# Altium footprint library ParsaLibrary.PcbLib: 526 footprints (part 9 of 33)
Each footprint in its own frame and in the unit in brackets; x right, y up, seen from the top. Pads: shape width x height; smd on the part's side, far side on the other; paste and mask are expansions set on the pad; w line width, h text height; cw(c..) or ccw(c..) is an arc to the next point about the centre after c.
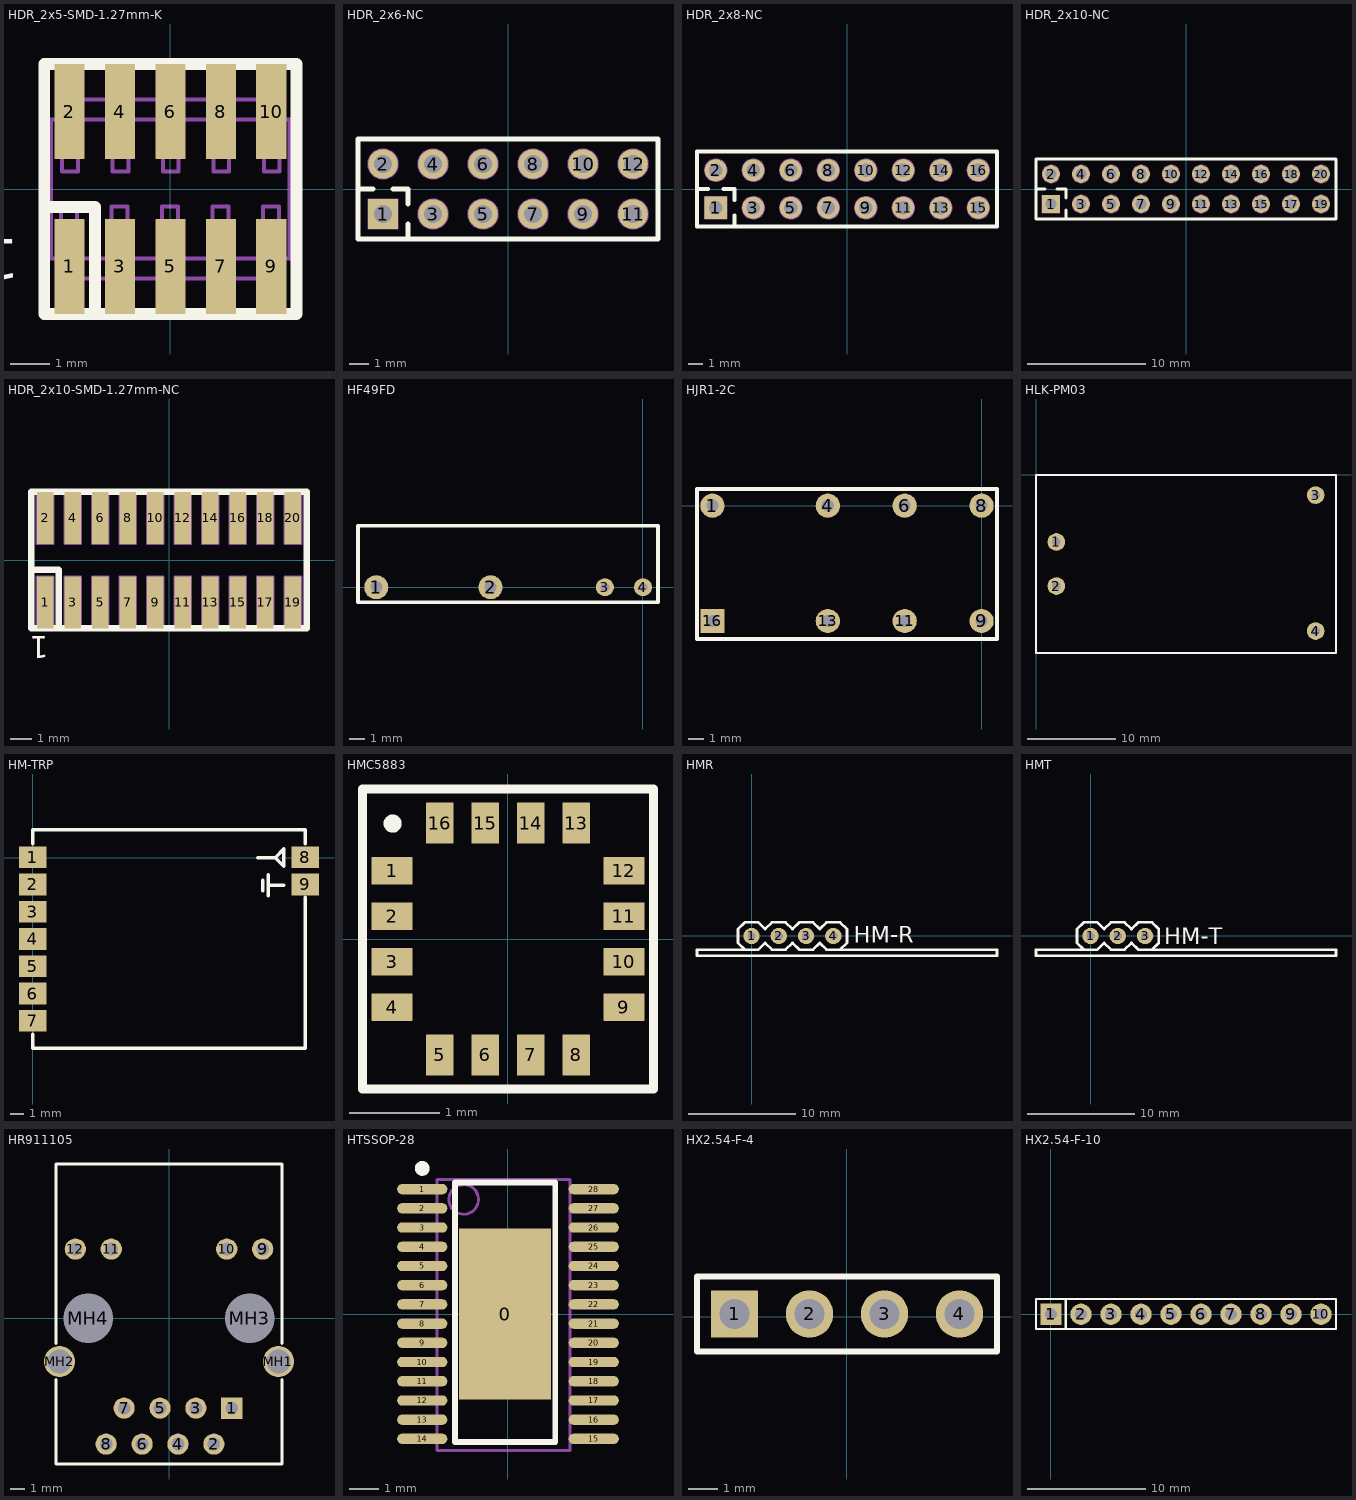
[diagram p8: the footprints below, top view; thin cyan lines are the x and y axes]

## HDR_2x5-SMD-1.27mm-K [mm]
pads (10):
  rect 0.76x2.4 smd: 1(-2.54,-1.95) 2(-2.54,1.95) 3(-1.27,-1.95) 4(-1.27,1.95) 5(0,-1.95) 6(0,1.95) 7(1.27,-1.95) 8(1.27,1.95) 9(2.54,-1.95) 10(2.54,1.95)
Top Overlay:
  lines w0.3: -3.175,-0.45 -1.9,-0.45 -1.9,-3.15 ; -3.175,-3.15 -3.175,3.15 3.175,3.15 3.175,-3.15 -3.175,-3.15
  text "1" at -3.81,-1.27 h1.02
Mechanical 7:
  lines w0.1: -2.74,-1.75 -2.74,-2.459 ccw(c-2.54,-2.459) -2.34,-2.459 -2.34,-2.25 ; -2.74,1.75 -2.74,2.459 cw(c-2.54,2.459) -2.34,2.459 -2.34,2.25 ; -2.5,-1.75 -2.5,-2.25 -1.25,-2.25 ; -2.5,1.75 -2.5,2.25 2.5,2.25 2.5,1.75 ; -1.47,-2.25 -1.47,-2.459 ccw(c-1.27,-2.459) -1.07,-2.459 -1.07,-2.25 ; -1.47,2.25 -1.47,2.459 cw(c-1.27,2.459) -1.07,2.459 -1.07,2.25 ; -1.25,-1.75 -1.25,-2.25 ; -0.2,-2.25 -0.2,-2.459 ccw(c0,-2.459) 0.2,-2.459 0.2,-2.25 ; -0.2,2.25 -0.2,2.459 cw(c0,2.459) 0.2,2.459 0.2,2.25 ; 1.07,-2.25 1.07,-2.459 ccw(c1.27,-2.459) 1.47,-2.459 1.47,-2.25 ; 1.07,2.25 1.07,2.459 cw(c1.27,2.459) 1.47,2.459 1.47,2.25 ; 1.25,-1.75 1.25,-2.25 ; 2.34,-2.25 2.34,-2.459 ccw(c2.54,-2.459) 2.74,-2.459 2.74,-1.75 ; 2.34,2.25 2.34,2.459 cw(c2.54,2.459) 2.74,2.459 2.74,1.75 ; 2.5,-1.75 2.5,-2.25 1.25,-2.25 ; -1.25,-2.25 1.25,-2.25 ; -3,-1.75 3,-1.75 3,1.75 -3,1.75 -3,-1.75 ; -2.75,-0.835 -2.35,-0.835 -2.35,-0.435 -2.75,-0.435 -2.75,-0.835 ; -2.73,0.435 -2.33,0.435 -2.33,0.835 -2.73,0.835 -2.73,0.435 ; -1.48,-0.835 -1.08,-0.835 -1.08,-0.435 -1.48,-0.435 -1.48,-0.835 ; -1.46,0.435 -1.06,0.435 -1.06,0.835 -1.46,0.835 -1.46,0.435 ; -0.21,-0.835 0.19,-0.835 0.19,-0.435 -0.21,-0.435 -0.21,-0.835 ; -0.19,0.435 0.21,0.435 0.21,0.835 -0.19,0.835 -0.19,0.435 ; 1.06,-0.835 1.46,-0.835 1.46,-0.435 1.06,-0.435 1.06,-0.835 ; 1.08,0.435 1.48,0.435 1.48,0.835 1.08,0.835 1.08,0.435 ; 2.33,-0.835 2.73,-0.835 2.73,-0.435 2.33,-0.435 2.33,-0.835 ; 2.35,0.435 2.75,0.435 2.75,0.835 2.35,0.835 2.35,0.435
  text ".Designator" at 0.356,0.152 h0.3
3D body "Samtec-FTSH-105-01-F-DV-K.step": height 6.11, standoff -0.01, extent -3.137,-2.921 3.137,2.921

## HDR_2x6-NC [mm]
pads (12):
  rect 1.5x1.5 hole 0.9: 1(-6.35,-1.27)
  round 1.5 hole 0.9: 2(-6.35,1.27) 3(-3.81,-1.27) 4(-3.81,1.27) 5(-1.27,-1.27) 6(-1.27,1.27) 7(1.27,-1.27) 8(1.27,1.27) 9(3.81,-1.27) 10(3.81,1.27) 11(6.35,-1.27) 12(6.35,1.27)
Top Overlay:
  lines w0.254: -7.62,0 -6.858,0 ; -5.842,0 -5.08,0 -5.08,-0.762 ; -5.08,-2.54 -5.08,-1.778 ; -7.62,-2.54 7.62,-2.54 7.62,2.54 -7.62,2.54 -7.62,-2.54
Mechanical 7:
  circle w0.1: c6.35,-1.27 r0.45
  circle w0.1: c6.35,-1.27 r0.75
  circle w0.1: c6.35,1.27 r0.75
  circle w0.1: c6.35,1.27 r0.45
  circle w0.1: c3.81,-1.27 r0.45
  circle w0.1: c3.81,-1.27 r0.75
  circle w0.1: c3.81,1.27 r0.75
  circle w0.1: c3.81,1.27 r0.45
  circle w0.1: c1.27,-1.27 r0.45
  circle w0.1: c1.27,-1.27 r0.75
  circle w0.1: c1.27,1.27 r0.75
  circle w0.1: c1.27,1.27 r0.45
  circle w0.1: c-1.27,-1.27 r0.45
  circle w0.1: c-1.27,-1.27 r0.75
  circle w0.1: c-1.27,1.27 r0.75
  circle w0.1: c-1.27,1.27 r0.45
  circle w0.1: c-3.81,1.27 r0.45
  circle w0.1: c-3.81,1.27 r0.75
  circle w0.1: c-6.35,1.27 r0.45
  circle w0.1: c-6.35,1.27 r0.75
  circle w0.1: c-3.81,-1.27 r0.75
  circle w0.1: c-3.81,-1.27 r0.45
  circle w0.1: c-6.35,-1.27 r0.45
  lines w0.1: -7.62,0 -6.858,0 ; -5.842,0 -5.08,0 -5.08,-0.762 ; -5.08,-2.54 -5.08,-1.778 ; -7.62,-2.54 -7.62,2.54 7.62,2.54 7.62,-2.54 -7.62,-2.54 ; -7.1,-2.02 -5.6,-2.02 -5.6,-0.52 -7.1,-0.52 -7.1,-2.02
  text ".Designator" at -0.525,-0.1 h0.31
Mechanical 8:
  circle w0.1: c-6.35,-1.27 r0.45
  circle w0.1: c-3.81,-1.27 r0.45
  circle w0.1: c-3.81,-1.27 r0.75
  circle w0.1: c-6.35,1.27 r0.75
  circle w0.1: c-6.35,1.27 r0.45
  circle w0.1: c-3.81,1.27 r0.75
  circle w0.1: c-3.81,1.27 r0.45
  circle w0.1: c-1.27,1.27 r0.45
  circle w0.1: c-1.27,1.27 r0.75
  circle w0.1: c-1.27,-1.27 r0.75
  circle w0.1: c-1.27,-1.27 r0.45
  circle w0.1: c1.27,1.27 r0.45
  circle w0.1: c1.27,1.27 r0.75
  circle w0.1: c1.27,-1.27 r0.75
  circle w0.1: c1.27,-1.27 r0.45
  circle w0.1: c3.81,1.27 r0.45
  circle w0.1: c3.81,1.27 r0.75
  circle w0.1: c3.81,-1.27 r0.75
  circle w0.1: c3.81,-1.27 r0.45
  circle w0.1: c6.35,1.27 r0.45
  circle w0.1: c6.35,1.27 r0.75
  circle w0.1: c6.35,-1.27 r0.75
  circle w0.1: c6.35,-1.27 r0.45
  lines w0.1: -7.1,-2.02 -7.1,-0.52 -5.6,-0.52 -5.6,-2.02 -7.1,-2.02

## HDR_2x8-NC [mm]
pads (16):
  rect 1.5x1.5 hole 0.9: 1(-8.89,-1.27)
  round 1.5 hole 0.9: 2(-8.89,1.27) 3(-6.35,-1.27) 4(-6.35,1.27) 5(-3.81,-1.27) 6(-3.81,1.27) 7(-1.27,-1.27) 8(-1.27,1.27) 9(1.27,-1.27) 10(1.27,1.27) 11(3.81,-1.27) 12(3.81,1.27) 13(6.35,-1.27) 14(6.35,1.27) 15(8.89,-1.27) 16(8.89,1.27)
Top Overlay:
  lines w0.254: -10.16,0 -9.398,0 ; -8.382,0 -7.62,0 -7.62,-0.762 ; -7.62,-2.54 -7.62,-1.778 ; -10.16,-2.54 -10.16,2.54 10.16,2.54 10.16,-2.54 -10.16,-2.54
Mechanical 7:
  circle w0.1: c-8.89,-1.27 r0.45
  circle w0.1: c-6.35,-1.27 r0.45
  circle w0.1: c-6.35,-1.27 r0.75
  circle w0.1: c-8.89,1.27 r0.75
  circle w0.1: c-8.89,1.27 r0.45
  circle w0.1: c-6.35,1.27 r0.75
  circle w0.1: c-6.35,1.27 r0.45
  circle w0.1: c-3.81,1.27 r0.45
  circle w0.1: c-3.81,1.27 r0.75
  circle w0.1: c-3.81,-1.27 r0.75
  circle w0.1: c-3.81,-1.27 r0.45
  circle w0.1: c-1.27,1.27 r0.45
  circle w0.1: c-1.27,1.27 r0.75
  circle w0.1: c-1.27,-1.27 r0.75
  circle w0.1: c-1.27,-1.27 r0.45
  circle w0.1: c1.27,1.27 r0.45
  circle w0.1: c1.27,1.27 r0.75
  circle w0.1: c1.27,-1.27 r0.75
  circle w0.1: c1.27,-1.27 r0.45
  circle w0.1: c3.81,1.27 r0.45
  circle w0.1: c3.81,1.27 r0.75
  circle w0.1: c3.81,-1.27 r0.75
  circle w0.1: c3.81,-1.27 r0.45
  circle w0.1: c6.35,1.27 r0.45
  circle w0.1: c6.35,1.27 r0.75
  circle w0.1: c6.35,-1.27 r0.75
  circle w0.1: c6.35,-1.27 r0.45
  circle w0.1: c8.89,1.27 r0.45
  circle w0.1: c8.89,1.27 r0.75
  circle w0.1: c8.89,-1.27 r0.75
  circle w0.1: c8.89,-1.27 r0.45
  lines w0.1: -10.16,0 -9.398,0 ; -8.382,0 -7.62,0 -7.62,-0.762 ; -7.62,-2.54 -7.62,-1.778 ; -10.16,-2.54 10.16,-2.54 10.16,2.54 -10.16,2.54 -10.16,-2.54 ; -9.64,-2.02 -9.64,-0.52 -8.14,-0.52 -8.14,-2.02 -9.64,-2.02
  text ".Designator" at -0.525,-0.1 h0.31
Mechanical 8:
  circle w0.1: c8.89,-1.27 r0.45
  circle w0.1: c8.89,-1.27 r0.75
  circle w0.1: c8.89,1.27 r0.75
  circle w0.1: c8.89,1.27 r0.45
  circle w0.1: c6.35,-1.27 r0.45
  circle w0.1: c6.35,-1.27 r0.75
  circle w0.1: c6.35,1.27 r0.75
  circle w0.1: c6.35,1.27 r0.45
  circle w0.1: c3.81,-1.27 r0.45
  circle w0.1: c3.81,-1.27 r0.75
  circle w0.1: c3.81,1.27 r0.75
  circle w0.1: c3.81,1.27 r0.45
  circle w0.1: c1.27,-1.27 r0.45
  circle w0.1: c1.27,-1.27 r0.75
  circle w0.1: c1.27,1.27 r0.75
  circle w0.1: c1.27,1.27 r0.45
  circle w0.1: c-1.27,-1.27 r0.45
  circle w0.1: c-1.27,-1.27 r0.75
  circle w0.1: c-1.27,1.27 r0.75
  circle w0.1: c-1.27,1.27 r0.45
  circle w0.1: c-3.81,-1.27 r0.45
  circle w0.1: c-3.81,-1.27 r0.75
  circle w0.1: c-3.81,1.27 r0.75
  circle w0.1: c-3.81,1.27 r0.45
  circle w0.1: c-6.35,1.27 r0.45
  circle w0.1: c-6.35,1.27 r0.75
  circle w0.1: c-8.89,1.27 r0.45
  circle w0.1: c-8.89,1.27 r0.75
  circle w0.1: c-6.35,-1.27 r0.75
  circle w0.1: c-6.35,-1.27 r0.45
  circle w0.1: c-8.89,-1.27 r0.45
  lines w0.1: -9.64,-2.02 -8.14,-2.02 -8.14,-0.52 -9.64,-0.52 -9.64,-2.02

## HDR_2x10-NC [mm]
pads (20):
  rect 1.5x1.5 hole 0.9: 1(-11.43,-1.27)
  round 1.5 hole 0.9: 2(-11.43,1.27) 3(-8.89,-1.27) 4(-8.89,1.27) 5(-6.35,-1.27) 6(-6.35,1.27) 7(-3.81,-1.27) 8(-3.81,1.27) 9(-1.27,-1.27) 10(-1.27,1.27) 11(1.27,-1.27) 12(1.27,1.27) 13(3.81,-1.27) 14(3.81,1.27) 15(6.35,-1.27) 16(6.35,1.27) 17(8.89,-1.27) 18(8.89,1.27) 19(11.43,-1.27) 20(11.43,1.27)
Top Overlay:
  lines w0.254: -12.7,0 -11.938,0 ; -10.922,0 -10.16,0 -10.16,-0.762 ; -10.16,-2.54 -10.16,-1.778 ; -12.7,-2.54 -12.7,2.54 12.7,2.54 12.7,-2.54 -12.7,-2.54
Mechanical 7:
  circle w0.1: c-11.43,-1.27 r0.45
  circle w0.1: c-8.89,-1.27 r0.45
  circle w0.1: c-8.89,-1.27 r0.75
  circle w0.1: c-11.43,1.27 r0.75
  circle w0.1: c-11.43,1.27 r0.45
  circle w0.1: c-8.89,1.27 r0.75
  circle w0.1: c-8.89,1.27 r0.45
  circle w0.1: c-6.35,1.27 r0.45
  circle w0.1: c-6.35,1.27 r0.75
  circle w0.1: c-6.35,-1.27 r0.75
  circle w0.1: c-6.35,-1.27 r0.45
  circle w0.1: c-3.81,1.27 r0.45
  circle w0.1: c-3.81,1.27 r0.75
  circle w0.1: c-3.81,-1.27 r0.75
  circle w0.1: c-3.81,-1.27 r0.45
  circle w0.1: c-1.27,1.27 r0.45
  circle w0.1: c-1.27,1.27 r0.75
  circle w0.1: c-1.27,-1.27 r0.75
  circle w0.1: c-1.27,-1.27 r0.45
  circle w0.1: c1.27,1.27 r0.45
  circle w0.1: c1.27,1.27 r0.75
  circle w0.1: c1.27,-1.27 r0.75
  circle w0.1: c1.27,-1.27 r0.45
  circle w0.1: c3.81,1.27 r0.45
  circle w0.1: c3.81,1.27 r0.75
  circle w0.1: c3.81,-1.27 r0.75
  circle w0.1: c3.81,-1.27 r0.45
  circle w0.1: c6.35,1.27 r0.45
  circle w0.1: c6.35,1.27 r0.75
  circle w0.1: c6.35,-1.27 r0.75
  circle w0.1: c6.35,-1.27 r0.45
  circle w0.1: c8.89,1.27 r0.45
  circle w0.1: c8.89,1.27 r0.75
  circle w0.1: c8.89,-1.27 r0.75
  circle w0.1: c8.89,-1.27 r0.45
  circle w0.1: c11.43,1.27 r0.45
  circle w0.1: c11.43,1.27 r0.75
  circle w0.1: c11.43,-1.27 r0.75
  circle w0.1: c11.43,-1.27 r0.45
  lines w0.1: -12.7,0 -11.938,0 ; -10.922,0 -10.16,0 -10.16,-0.762 ; -10.16,-2.54 -10.16,-1.778 ; -12.7,-2.54 12.7,-2.54 12.7,2.54 -12.7,2.54 -12.7,-2.54 ; -12.18,-2.02 -12.18,-0.52 -10.68,-0.52 -10.68,-2.02 -12.18,-2.02
  text ".Designator" at -0.525,-0.1 h0.31
Mechanical 8:
  circle w0.1: c11.43,-1.27 r0.45
  circle w0.1: c11.43,-1.27 r0.75
  circle w0.1: c11.43,1.27 r0.75
  circle w0.1: c11.43,1.27 r0.45
  circle w0.1: c8.89,-1.27 r0.45
  circle w0.1: c8.89,-1.27 r0.75
  circle w0.1: c8.89,1.27 r0.75
  circle w0.1: c8.89,1.27 r0.45
  circle w0.1: c6.35,-1.27 r0.45
  circle w0.1: c6.35,-1.27 r0.75
  circle w0.1: c6.35,1.27 r0.75
  circle w0.1: c6.35,1.27 r0.45
  circle w0.1: c3.81,-1.27 r0.45
  circle w0.1: c3.81,-1.27 r0.75
  circle w0.1: c3.81,1.27 r0.75
  circle w0.1: c3.81,1.27 r0.45
  circle w0.1: c1.27,-1.27 r0.45
  circle w0.1: c1.27,-1.27 r0.75
  circle w0.1: c1.27,1.27 r0.75
  circle w0.1: c1.27,1.27 r0.45
  circle w0.1: c-1.27,-1.27 r0.45
  circle w0.1: c-1.27,-1.27 r0.75
  circle w0.1: c-1.27,1.27 r0.75
  circle w0.1: c-1.27,1.27 r0.45
  circle w0.1: c-3.81,-1.27 r0.45
  circle w0.1: c-3.81,-1.27 r0.75
  circle w0.1: c-3.81,1.27 r0.75
  circle w0.1: c-3.81,1.27 r0.45
  circle w0.1: c-6.35,-1.27 r0.45
  circle w0.1: c-6.35,-1.27 r0.75
  circle w0.1: c-6.35,1.27 r0.75
  circle w0.1: c-6.35,1.27 r0.45
  circle w0.1: c-8.89,1.27 r0.45
  circle w0.1: c-8.89,1.27 r0.75
  circle w0.1: c-11.43,1.27 r0.45
  circle w0.1: c-11.43,1.27 r0.75
  circle w0.1: c-8.89,-1.27 r0.75
  circle w0.1: c-8.89,-1.27 r0.45
  circle w0.1: c-11.43,-1.27 r0.45
  lines w0.1: -12.18,-2.02 -10.68,-2.02 -10.68,-0.52 -12.18,-0.52 -12.18,-2.02

## HDR_2x10-SMD-1.27mm-NC [mm]
pads (20):
  rect 0.76x2.4 smd paste-5: 1(-5.715,-1.95) 2(-5.715,1.95) 3(-4.445,-1.95) 4(-4.445,1.95) 5(-3.175,-1.95) 6(-3.175,1.95) 7(-1.905,-1.95) 8(-1.905,1.95) 9(-0.635,-1.95) 10(-0.635,1.95) 11(0.635,-1.95) 12(0.635,1.95) 13(1.905,-1.95) 14(1.905,1.95) 15(3.175,-1.95) 16(3.175,1.95) 17(4.445,-1.95) 18(4.445,1.95) 19(5.715,-1.95) 20(5.715,1.95)
Top Overlay:
  lines w0.3: -6.35,-0.45 -5.075,-0.45 -5.075,-3.15 ; -6.35,-3.15 -6.35,3.15 6.35,3.15 6.35,-3.15 -6.35,-3.15
  text "1" at -5.537,-3.505 h1.02
Mechanical 7:
  lines w0.1: -6.35,-3.15 6.35,-3.15 6.35,3.15 -6.35,3.15 -6.35,-3.15 ; -6.095,-3.15 -5.335,-3.15 -5.335,-0.75 -6.095,-0.75 -6.095,-3.15 ; -6.095,0.75 -5.335,0.75 -5.335,3.15 -6.095,3.15 -6.095,0.75 ; -4.825,-3.15 -4.065,-3.15 -4.065,-0.75 -4.825,-0.75 -4.825,-3.15 ; -4.825,0.75 -4.065,0.75 -4.065,3.15 -4.825,3.15 -4.825,0.75 ; -3.555,-3.15 -2.795,-3.15 -2.795,-0.75 -3.555,-0.75 -3.555,-3.15 ; -3.555,0.75 -3.555,3.15 -2.795,3.15 -2.795,0.75 -3.555,0.75 ; -2.285,-3.15 -1.525,-3.15 -1.525,-0.75 -2.285,-0.75 -2.285,-3.15 ; -2.285,0.75 -1.525,0.75 -1.525,3.15 -2.285,3.15 -2.285,0.75 ; -1.015,-3.15 -0.255,-3.15 -0.255,-0.75 -1.015,-0.75 -1.015,-3.15 ; -1.015,0.75 -0.255,0.75 -0.255,3.15 -1.015,3.15 -1.015,0.75 ; 0.255,-3.15 1.015,-3.15 1.015,-0.75 0.255,-0.75 0.255,-3.15 ; 0.255,0.75 1.015,0.75 1.015,3.15 0.255,3.15 0.255,0.75 ; 1.525,-3.15 2.285,-3.15 2.285,-0.75 1.525,-0.75 1.525,-3.15 ; 1.525,0.75 2.285,0.75 2.285,3.15 1.525,3.15 1.525,0.75 ; 2.795,-3.15 3.555,-3.15 3.555,-0.75 2.795,-0.75 2.795,-3.15 ; 2.795,0.75 3.555,0.75 3.555,3.15 2.795,3.15 2.795,0.75 ; 4.065,-3.15 4.825,-3.15 4.825,-0.75 4.065,-0.75 4.065,-3.15 ; 4.065,0.75 4.825,0.75 4.825,3.15 4.065,3.15 4.065,0.75 ; 5.335,-3.15 6.095,-3.15 6.095,-0.75 5.335,-0.75 5.335,-3.15 ; 5.335,0.75 6.095,0.75 6.095,3.15 5.335,3.15 5.335,0.75
  text ".Designator" at -0.8,-0.2 h0.38

## HF49FD [mm]
pads (4):
  round 1.6 hole 0.8: 1(-17.78,0) 2(-10.16,0)
  round 1.2 hole 0.6: 3(-2.54,0) 4(0,0)
Top Overlay:
  lines w0.254: -19,-1 -19,4.1 1,4.1 1,-1 -19,-1
3D body "User Library-HF49FD-1H12.step": height 12.5, standoff -3.2, extent -19,-0.95 1,4.1

## HJR1-2C [mm]
pads (8):
  round 1.6 hole 0.8: 1(-17.78,0) 4(-10.16,0) 6(-5.08,0) 8(0,0) 9(0,-7.62) 11(-5.08,-7.62) 13(-10.16,-7.62)
  rect 1.6x1.6 hole 0.8: 16(-17.78,-7.62)
Top Overlay:
  lines w0.254: 1,-8.8 -18.8,-8.8 -18.8,1.09 1,1.09 ; 1.02,-8.8 1.02,1.09
3D body: height -1, standoff -3, extent -5.33,-7.87 -4.83,-7.37
3D body: height -1, standoff -3, extent -10.41,-7.87 -9.91,-7.37
3D body: height -1, standoff -3, extent -18.03,-7.87 -17.53,-7.37
3D body: height -1, standoff -3, extent -10.39,-0.21 -9.89,0.29
3D body: height -1, standoff -3, extent -5.31,-0.21 -4.81,0.29
3D body: height -1, standoff -3, extent -18.03,-0.25 -17.53,0.25
3D body: height 6.9, standoff 0, extent -18.8,-8.8 1,1.11
3D body: height -1, standoff -3, extent -0.25,-7.87 0.25,-7.37
3D body: height -1, standoff -3, extent -0.23,-0.25 0.27,0.25

## HLK-PM03 [mm]
height 15
pads (4):
  round 2 hole 1: 1(2.3,-7.6) 2(2.3,-12.6) 3(31.7,-2.3) 4(31.7,-17.7)
Top Overlay:
  lines w0.254: 0,-20.2 34,-20.2 34,0 0,0 0,-20.2
3D body "User Library-HLK-PM01.step": height 15.1, standoff -5, extent 0,-20.2 34,0

## HM-TRP [mm]
pads (9):
  rect 2x1.6 smd: 1(0,0.032) 2(0,-1.968) 3(0,-3.968) 4(0,-5.968) 5(0,-7.968) 6(0,-9.968) 7(0,-11.968) 8(20,0.032) 9(20,-1.968)
Top Overlay:
  lines w0.254: 0,-12.954 0,-13.968 20,-13.968 20,-2.921 ; 0,1.016 0,2.032 20,2.032 20,1.016 ; 16.51,0 17.78,0 ; 16.891,-2.413 16.891,-1.651 ; 17.272,-2.794 17.272,-1.27 ; 17.272,-2.032 18.415,-2.032 ; 17.78,0 18.415,0.635 18.415,-0.635 ; 17.78,0 18.415,-0.635 ; 17.78,0 18.415,-0.635
3D body "User Library-HM-TRP-868S.step": height 2, standoff -0.01, extent 0.033,-13.969 20.033,2.031

## HMC5883 [mm]
pads (16):
  rect 0.45x0.3 smd mask+0.01: 1(-1.275,0.75) 2(-1.275,0.25) 3(-1.275,-0.25) 4(-1.275,-0.75) 9(1.275,-0.75) 10(1.275,-0.25) 11(1.275,0.25) 12(1.275,0.75)
  rect 0.3x0.45 smd mask+0.01: 5(-0.75,-1.275) 6(-0.25,-1.275) 7(0.25,-1.275) 8(0.75,-1.275) 13(0.75,1.275) 14(0.25,1.275) 15(-0.25,1.275) 16(-0.75,1.275)
Top Overlay:
  circle w0.1: c-1.27,1.27 r0.05
  lines w0.1: -1.6,-1.651 -1.6,1.651 1.6,1.651 1.6,-1.651 -1.6,-1.651
3D body: height 0.8, standoff 0, extent -1.549,-1.6 1.549,1.6

## HMR [mil]
height 551.18
pads (4):
  round 60 hole 30: 1(0,0) 2(100,0) 3(200,0) 4(300,0)
Top Overlay:
  lines w10: -25,-50 25,-50 50,-25 75,-50 125,-50 150,-25 175,-50 225,-50 250,-25 275,-50 325,-50 ; -25,-50 -200,-50 -200,-72.17 900,-72.17 900,-50 325,-50 ; -25,-50 -50,-25 -50,25 -25,50 25,50 50,25 75,50 125,50 150,25 175,50 225,50 250,25 275,50 325,50 350,25 350,-25 325,-50
  text "HM-R" at 375,-25 h60

## HMT [mil]
height 551.18
pads (3):
  round 60 hole 30: 1(0,0) 2(100,0) 3(200,0)
Top Overlay:
  lines w10: -25,-50 -50,-25 -50,25 -25,50 25,50 50,25 75,50 125,50 150,25 175,50 225,50 250,25 250,-25 225,-50 ; -25,-50 -200,-50 -200,-72.17 900,-72.17 900,-50 225,-50 ; -25,-50 25,-50 50,-25 75,-50 125,-50 150,-25 175,-50 225,-50
  text "HM-T" at 270,-30 h60

## HR911105 [mm]
pads (16):
  rect 1.5x1.5 hole 0.9: 1(4.445,-6.35)
  round 1.5 hole 0.9: 2(3.175,-8.89) 3(1.905,-6.35) 4(0.635,-8.89) 5(-0.635,-6.35) 6(-1.905,-8.89) 7(-3.175,-6.35) 8(-4.445,-8.89) 9(6.625,4.9) 10(4.085,4.9) 11(-4.085,4.9) 12(-6.625,4.9)
  round 2.2 hole 1.7: MH1(7.745,-3.05) MH2(-7.745,-3.05)
  round 3.25 hole 3.5 unplated: MH3(5.715,0) MH4(-5.715,0)
Top Overlay:
  lines w0.2: -8.003,-1.778 -8,10.92 8,10.92 ; -8,-4.318 -8,-10.3 8,-10.3 ; 8.001,-10.3 8.001,-4.318 ; 8.004,-1.778 8.004,10.92
3D body "User Library-RJ45-01-J0011D01BNL.STEP": height 13.57, standoff -3.94, extent -8.271,-10.495 8.329,10.852

## HTSSOP-28 [mm]
pads (29):
  rect 3.1x5.8 smd: 0(-0.1,0)
  oval 1.7x0.35 smd: 1(-2.9,4.225) 2(-2.9,3.575) 3(-2.9,2.925) 4(-2.9,2.275) 5(-2.9,1.625) 6(-2.9,0.975) 7(-2.9,0.325) 8(-2.9,-0.325) 9(-2.9,-0.975) 10(-2.9,-1.625) 11(-2.9,-2.275) 12(-2.9,-2.925) 13(-2.9,-3.575) 14(-2.9,-4.225) 15(2.9,-4.225) 16(2.9,-3.575) 17(2.9,-2.925) 18(2.9,-2.275) 19(2.9,-1.625) 20(2.9,-0.975) 21(2.9,-0.325) 22(2.9,0.325) 23(2.9,0.975) 24(2.9,1.625) 25(2.9,2.275) 26(2.9,2.925) 27(2.9,3.575) 28(2.9,4.225)
Top Overlay:
  circle w0.25: c-2.9,4.925 r0.125
  lines w0.2: -1.8,-4.325 1.6,-4.325 1.6,4.45 -1.8,4.45 -1.8,-4.325
Mechanical 13:
  circle w0.1: c-1.5,3.875 r0.5
  lines w0.1: -2.4,-4.625 2.1,-4.625 2.1,4.55 -2.4,4.55 -2.4,-4.625
3D body "User Library-PWP (R-PDSO-G28).STEP": height 1.2, standoff 0, extent -3.31,-4.9 3.31,4.9

## HX2.54-F-4 [mm]
pads (4):
  rect 1.6x1.6 hole 1: 1(-3.8,0.1)
  round 1.6 hole 1: 2(-1.26,0.1) 3(1.28,0.1) 4(3.82,0.1)
Top Overlay:
  lines w0.2: -5.07,-1.17 5.09,-1.17 5.09,1.37 -5.07,1.37 -5.07,-1.17
3D body "User Library-HeaderRangLuocDonThang2_54mm (1).SLDPRT": height 8.5, standoff -3.2, extent -5.07,-1.2 5.09,1.34

## HX2.54-F-10 [mm]
pads (10):
  rect 1.8x1.8 hole 1: 1(0,0)
  round 1.8 hole 1: 2(2.54,0) 3(5.08,0) 4(7.62,0) 5(10.16,0) 6(12.7,0) 7(15.24,0) 8(17.78,0) 9(20.32,0) 10(22.86,0)
Top Overlay:
  lines w0.2: 1.25,-1.2 1.25,1.2 ; -1.27,-1.25 -1.27,1.29 24.13,1.29 24.13,-1.25 -1.27,-1.25
3D body "User Library-HeaderRangLuocDonThang2_54mm.SLDPRT": height 8.5, standoff -3.2, extent -1.27,-1.25 24.13,1.29